# Altium footprint library Stepper_Board.PcbLib: 49 footprints (part 1 of 4)
Each footprint in its own frame and in the unit in brackets; x right, y up, seen from the top. Pads: shape width x height; smd on the part's side, far side on the other; paste and mask are expansions set on the pad; w line width, h text height; cw(c..) or ccw(c..) is an arc to the next point about the centre after c.
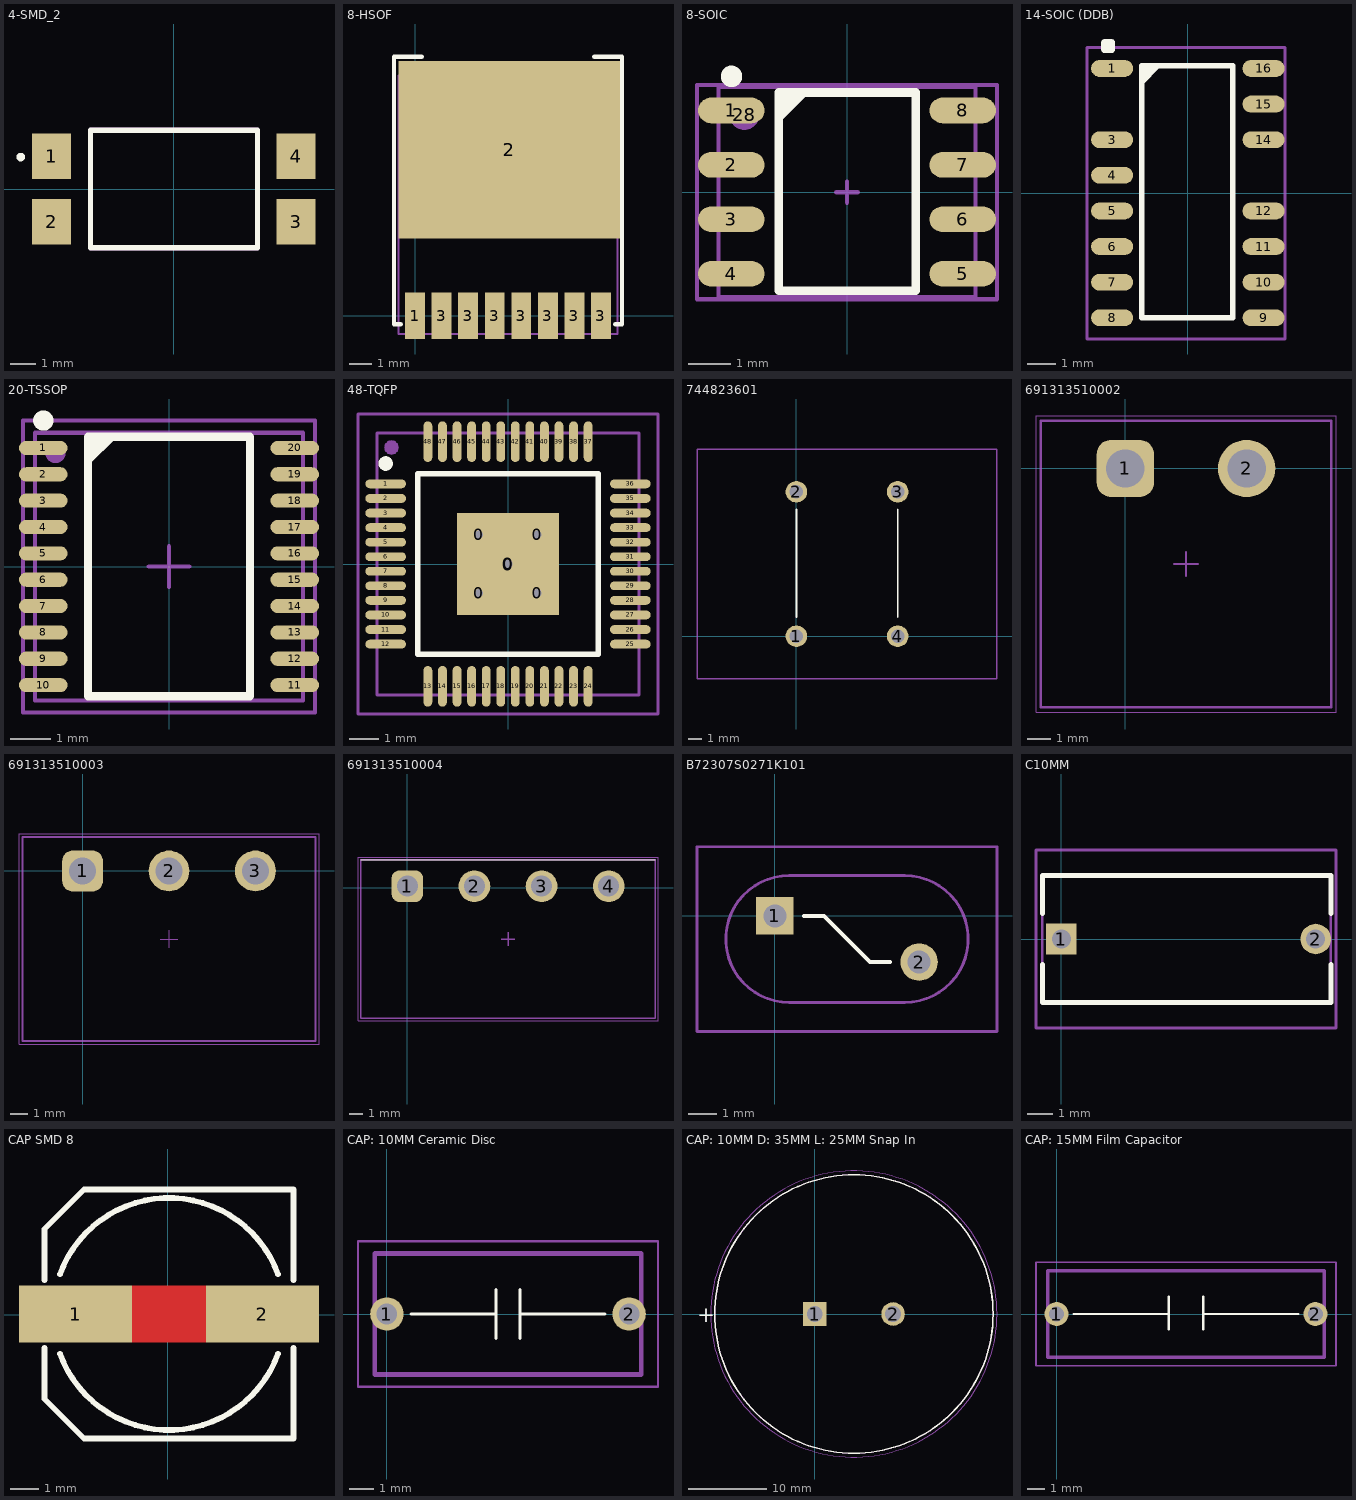
[diagram p0: the footprints below, top view; thin cyan lines are the x and y axes]

## 4-SMD_2 [mm] "Pitch 2.54mm"
pads (4):
  rect 1.52x1.78 smd: 1(-4.76,1.27) 2(-4.76,-1.27) 3(4.76,-1.27) 4(4.76,1.27)
Top Overlay:
  circle w0.2: c-5.964,1.244 r0.067
  lines w0.2: -3.25,-2.29 3.25,-2.29 3.25,2.29 -3.25,2.29 -3.25,-2.29
Mechanical 13:
  lines w0.2: -3.25,-2.29 -3.25,2.29 3.25,2.29 3.25,-2.29 -3.25,-2.29
3D body "VO618A-3X017T.stp": height 3.76, standoff 0.07, extent -5.08,-2.29 5.08,2.29

## 8-HSOF [mm] "8-HSOF"
pads (9):
  rect 0.9x2.1 smd: 1(0,0) 3(1.2,0) 3(2.4,0) 3(3.6,0) 3(4.8,0) 3(6,0) 3(7.2,0) 3(8.4,0)
  rect 10x8 smd: 2(4.25,7.5)
Top Overlay:
  lines w0.2: -0.65,-0.375 -0.95,-0.375 -0.95,11.7 0.3,11.7 ; 8.1,11.7 9.35,11.7 9.35,-0.375 9.05,-0.375
Mechanical 1:
  lines w0.1: -0.75,-0.828 9.15,-0.828 9.15,10.847 -0.75,10.847 -0.75,-0.828
3D body "User Library-PG-HSOF-8-1.STEP": height 2.3, standoff 0, extent -0.75,-0.828 9.15,10.847

## 8-SOIC [mm]
pads (9):
  rrect100% 1.55x0.6 smd: 1(-2.7,1.905) 2(-2.7,0.635) 3(-2.7,-0.635) 4(-2.7,-1.905) 5(2.7,-1.905) 6(2.7,-0.635) 7(2.7,0.635) 8(2.7,1.905)
  round 0.7 on Mech1: 28(-2.395,1.8)
Top Overlay:
  circle w0.25: c-2.695,2.7 r0.125
  region: -1.595,2.325 -1.595,1.605 -0.875,2.325
  lines w0.2: -1.595,-2.3 -1.595,2.325 1.605,2.325 1.605,-2.3 -1.595,-2.3
Mechanical 1:
  lines w0.1: -3,-2.45 3,-2.45 3,2.45 -3,2.45 -3,-2.45
Mechanical 15:
  lines w0.1: -0.25,0 0.25,0 ; 0,-0.25 0,0.25 ; -3.5,-2.5 3.5,-2.5 3.5,2.5 -3.5,2.5 -3.5,-2.5
3D body "User Library-SOIC-8-1.STEP": height 1.75, standoff 0, extent -3,-2.45 3,2.45

## 14-SOIC (DDB) [mm]
pads (15):
  oval 1.5x0.6 smd: 1(-2.7,4.445) 3(-2.7,1.905) 4(-2.7,0.635) 5(-2.7,-0.635) 6(-2.7,-1.905) 7(-2.7,-3.175) 8(-2.7,-4.445) 9(2.7,-4.445) 10(2.7,-3.175) 11(2.7,-1.905) 12(2.7,-0.635) 14(2.7,1.905) 15(2.7,3.175) 16(2.7,4.445)
  rrect50% 0.5x0.5 on Top Overlay: ""(-2.842,5.245)
Top Overlay:
  region: -1.664,4.535 -1.664,3.815 -0.944,4.535
  lines w0.2: -1.642,-4.445 -1.642,4.535 1.6,4.535 1.6,-4.445 -1.642,-4.445
Mechanical 15:
  lines w0.1: -3.592,-5.2 3.46,-5.2 3.46,4.498 3.46,5.195 -3.592,5.195 -3.592,-5.2
3D body "DDB0014A.stp": height 1.75, standoff 0, extent -3.013,-4.95 3.013,4.95

## 20-TSSOP [mm] "pitch 0.65 mm"
height 1.2
pads (21):
  oval 1.2x0.35 smd: 1(-3.1,2.925) 2(-3.1,2.275) 3(-3.1,1.625) 4(-3.1,0.975) 5(-3.1,0.325) 6(-3.1,-0.325) 7(-3.1,-0.975) 8(-3.1,-1.625) 9(-3.1,-2.275) 10(-3.1,-2.925) 11(3.1,-2.925) 12(3.1,-2.275) 13(3.1,-1.625) 14(3.1,-0.975) 15(3.1,-0.325) 16(3.1,0.325) 17(3.1,0.975) 18(3.1,1.625) 19(3.1,2.275) 20(3.1,2.925)
  round 0.5 on Mech1: ""(-2.8,2.8)
Top Overlay:
  circle w0.25: c-3.1,3.6 r0.125
  region: -2,3.2 -2,2.48 -1.28,3.2
  lines w0.2: -2,-3.2 2,-3.2 2,3.2 -2,3.2 -2,-3.2
Mechanical 1:
  lines w0.1: -3.3,-3.3 -3.3,3.3 3.3,3.3 3.3,-3.3 -3.3,-3.3
Mechanical 15:
  lines w0.1: -0.5,0 0.5,0 ; 0,-0.5 0,0.5 ; -3.6,-3.6 -3.6,3.6 3.6,3.6 3.6,-3.6 -3.6,-3.6
3D body "TSSOP-20.STEP": height 1.2, standoff 0, extent -3.3,-3.3 3.3,3.3

## 48-TQFP [mm] "pitch 0.5 mm, power pad"
height 1.2
pads (55):
  round 0.7 hole 0.3: 0(-1,-1) 0(-1,1) 0(0,0) 0(1,-1) 0(1,1)
  rect 3.5x3.5 smd: 0(0,0)
  oval 1.4x0.3 smd: 1(-4.2,2.75) 2(-4.2,2.25) 3(-4.2,1.75) 4(-4.2,1.25) 5(-4.2,0.75) 6(-4.2,0.25) 7(-4.2,-0.25) 8(-4.2,-0.75) 9(-4.2,-1.25) 10(-4.2,-1.75) 11(-4.2,-2.25) 12(-4.2,-2.75) 25(4.2,-2.75) 26(4.2,-2.25) 27(4.2,-1.75) 28(4.2,-1.25) 29(4.2,-0.75) 30(4.2,-0.25) 31(4.2,0.25) 32(4.2,0.75) 33(4.2,1.25) 34(4.2,1.75) 35(4.2,2.25) 36(4.2,2.75)
  oval 0.3x1.4 smd: 13(-2.75,-4.2) 14(-2.25,-4.2) 15(-1.75,-4.2) 16(-1.25,-4.2) 17(-0.75,-4.2) 18(-0.25,-4.2) 19(0.25,-4.2) 20(0.75,-4.2) 21(1.25,-4.2) 22(1.75,-4.2) 23(2.25,-4.2) 24(2.75,-4.2) 37(2.75,4.2) 38(2.25,4.2) 39(1.75,4.2) 40(1.25,4.2) 41(0.75,4.2) 42(0.25,4.2) 43(-0.25,4.2) 44(-0.75,4.2) 45(-1.25,4.2) 46(-1.75,4.2) 47(-2.25,4.2) 48(-2.75,4.2)
  round 0.5 on Mech1: ""(-4,4)
Top Overlay:
  circle w0.25: c-4.2,3.45 r0.125
  lines w0.2: -3.1,-3.1 -3.1,3.1 3.1,3.1 3.1,-3.1 -3.1,-3.1
Mechanical 1:
  lines w0.1: -4.5,-4.5 -4.5,4.5 4.5,4.5 4.5,-4.5 -4.5,-4.5
Mechanical 15:
  lines w0.1: -0.5,0 0.5,0 ; 0,-0.5 0,0.5 ; -5.15,-5.15 -5.15,5.15 5.15,5.15 5.15,-5.15 -5.15,-5.15
3D body "48-TQFP.step": height 1.2, standoff 0, extent -4.5,-4.5 4.5,4.5

## 744823601 [mm]
pads (4):
  round 1.6 hole 1: 1(0,0) 2(0,10.7) 3(7.5,10.7) 4(7.5,0)
Top Overlay:
  lines w0.127: 0,1.397 0,9.398 ; 7.5,1.397 7.5,9.398
Mechanical 1:
  lines w0.1: -7.366,-3.15 -7.366,13.85 14.859,13.85 14.859,-3.15 -7.366,-3.15
3D body "744823601.stp": height 26.51, standoff -2.99, extent -7.299,-3.15 14.799,13.85

## 691313510002 [mm] "5,08mm - PCB Headers - Horizontal - Closed ends - 02p"
height 8.5
pads (2):
  rrect50% 2.4x2.4 hole 1.6: 1(0,0)
  round 2.4 hole 1.6: 2(5.08,0)
Top Courtyard:
  lines w0.05: -3.74,-10.2 -3.74,2.2 8.82,2.2 8.82,-10.2 -3.74,-10.2
Top Assembly:
  lines w0.1: -3.54,-10 8.62,-10 8.62,2 -3.54,2 -3.54,-10
Top 3D Body:
  lines w0.1: -3.54,-10 -3.54,2 8.62,2 8.62,-10 -3.54,-10
Top Component Center:
  lines w0.1: 2.04,-4 3.04,-4 ; 2.54,-4.5 2.54,-3.5
3D body "691313510002.stp": height 8.55, standoff -3.45, extent -3.54,-10 8.62,2
3D body "691351500002 (rev1).stp": height 15.35, standoff 0.25, extent -2.64,-19.88 7.62,-1.68

## 691313510003 [mm] "5,08mm - PCB Headers - Horizontal - Closed ends - 03p"
height 8.5
pads (3):
  rrect50% 2.4x2.4 hole 1.6: 1(0,0)
  round 2.4 hole 1.6: 2(5.08,0) 3(10.16,0)
Top Courtyard:
  lines w0.05: -3.74,-10.2 13.9,-10.2 13.9,2.2 -3.74,2.2 -3.74,-10.2
Top 3D Body:
  lines w0.1: -3.54,-10 13.7,-10 13.7,2 -3.54,2 -3.54,-10
Top Component Outline:
  lines w0.1: -3.54,-10 -3.54,2 13.7,2 13.7,-10 -3.54,-10
Bottom Component Center:
  lines w0.05: 4.58,-4 5.58,-4 ; 5.08,-4.5 5.08,-3.5
3D body "691351500003 (rev1).stp": height 15.35, standoff 0.25, extent -2.64,-19.88 12.7,-1.68
3D body "691313510003.stp": height 8.55, standoff -3.45, extent -3.54,-10 13.7,2

## 691313510004 [mm] "5,08mm - PCB Headers - Horizontal - Closed ends - 04p"
height 8.5
pads (4):
  rrect50% 2.4x2.4 hole 1.6: 1(0,0.1)
  round 2.4 hole 1.6: 2(5.08,0.1) 3(10.16,0.1) 4(15.24,0.1)
Top Overlay:
  lines w0.022: -3.54,2.1 18.78,2.1
Top Courtyard:
  lines w0.05: -3.74,-10.1 18.98,-10.1 18.98,2.3 -3.74,2.3 -3.74,-10.1
Top Assembly:
  lines w0.1: -3.54,-9.9 -3.54,2.1 18.78,2.1 18.78,-9.9 -3.54,-9.9
Top 3D Body:
  lines w0.1: -3.54,-9.9 -3.54,2.1 18.78,2.1 18.78,-9.9 -3.54,-9.9
Top Component Center:
  lines w0.1: 7.12,-3.9 8.12,-3.9 ; 7.62,-4.4 7.62,-3.4
3D body "691313510004.stp": height 8.55, standoff -3.45, extent -3.54,-9.9 18.78,2.1
3D body "691351500004 (rev1).stp": height 15.35, standoff 0.25, extent -2.64,-19.78 17.78,-1.58

## B72307S0271K101 [mm]
pads (2):
  rect 1.3x1.3 hole 0.8: 1(0,0)
  round 1.3 hole 0.8: 2(5,-1.6)
Top Overlay:
  lines w0.127: 1,0 1.7,0 3.3,-1.6 4,-1.6
Top Courtyard:
  lines w0.1: 0.5,-3 cw(c0.5,-0.8) 0.5,1.4 4.5,1.4 cw(c4.5,-0.8) 4.5,-3 0.5,-3
Mechanical 20:
  lines w0.1: -2.7,-4 -2.7,2.4 7.7,2.4 7.7,-4 -2.7,-4
3D body "B72307S0271K101.stp": height 14.66, standoff -21.34, extent -1.709,-2.875 6.789,1.524

## C10MM [mm]
pads (2):
  rect 1.2x1.2 hole 0.75: 1(0,0)
  round 1.2 hole 0.75: 2(10,0)
Top Overlay:
  lines w0.2: -0.75,-1 -0.75,-2.5 10.6,-2.5 10.6,-1 ; -0.75,1 -0.75,2.5 10.6,2.5 10.6,1
Top Courtyard:
  lines w0.1: -0.75,-2.5 -0.75,2.5 10.6,2.5 10.6,-2.5 -0.75,-2.5
Mechanical 20:
  lines w0.1: -1,-3.5 -1,3.5 10.8,3.5 10.8,-3.5 -1,-3.5
3D body "CD45-E2GA222M-NKA.STEP": height 16, standoff -18, extent -0.4,-3 10.4,3

## CAP SMD 8 [mm] "Electrolytic Cap, Size E, Size F, 8.3X10"
height 10
pads (2):
  rect 4x2 smd: 1(-3.248,0.026) 2(3.352,0.026)
Top Layer:
  pour cut-out: 1.352,1.023 1.352,-0.973 -1.248,-0.973 -1.248,1.023
Top Overlay:
  lines w0.2: -4.348,-1.174 -4.348,-2.974 -2.948,-4.374 4.452,-4.374 4.452,-1.174 ; -4.348,1.226 -4.348,3.026 -2.948,4.426 4.452,4.426 4.452,1.226 ; -3.801,-1.376 ccw(c0.052,0.026) 3.905,-1.376 ; -3.801,1.428 cw(c0.052,0.026) 3.905,1.428
3D body "Cap_0810.STEP": height 10.3, standoff -0.2, extent -4.85,-4.224 4.85,4.276

## CAP: 10MM Ceramic Disc [mm]
pads (2):
  round 1.381 hole 0.85: 1(0,0) 2(10,0)
Top Overlay:
  lines w0.127: 1,0 4.5,0 ; 4.5,-1 4.5,1 ; 5.5,-1 5.5,1 ; 5.5,0 9,0
Mechanical 13:
  lines w0.2: -0.5,-2.5 -0.5,2.5 10.5,2.5 10.5,-2.5 -0.5,-2.5
Mechanical 15:
  lines w0.1: -1.191,-3 -1.191,3 11.191,3 11.191,-3 -1.191,-3
3D body "VY1222M43Y5UC63V0.stp": height 15.12, standoff -29.86, extent -0.444,-2.5 10.444,2.5

## CAP: 10MM D: 35MM L: 25MM Snap In [mm]
pads (2):
  rect 3x3 hole 2: 1(0,0)
  round 3 hole 2: 2(10,0)
Top Overlay:
  circle w0.2: c5,0 r17.75
  text "+" at -15,-1.033 h2
Mechanical 13:
  circle w0.1: c5,0 r17.75
Mechanical 15:
  circle w0.05: c5,0 r18.25
3D body "ESMR451VSN331MA25S.stp": height 27.5, standoff -10, extent -12.982,-17.996 23,17.996

## CAP: 15MM Film Capacitor [mm]
pads (2):
  round 1.381 hole 0.85: 1(0,0) 2(15,0)
Top Overlay:
  lines w0.127: 1,0 6.5,-0.002 ; 6.5,-0.9 6.5,1 ; 8.5,-0.9 8.5,1 ; 8.5,0.002 14,0
Mechanical 13:
  lines w0.2: -0.5,-2.5 -0.5,2.5 15.5,2.5 15.5,-2.5 -0.5,-2.5
Mechanical 15:
  lines w0.1: -1.191,-3 -1.191,3 16.191,3 16.191,-3 -1.191,-3
3D body "R46KI310050M1M.stp": height 11.1, standoff -27, extent -1.65,-2.605 16.65,2.6